# Altium footprint library ArduinoMega.PcbLib: 1 footprints
Each footprint in its own frame and in the unit in brackets; x right, y up, seen from the top. Pads: shape width x height; smd on the part's side, far side on the other; paste and mask are expansions set on the pad; w line width, h text height; cw(c..) or ccw(c..) is an arc to the next point about the centre after c.
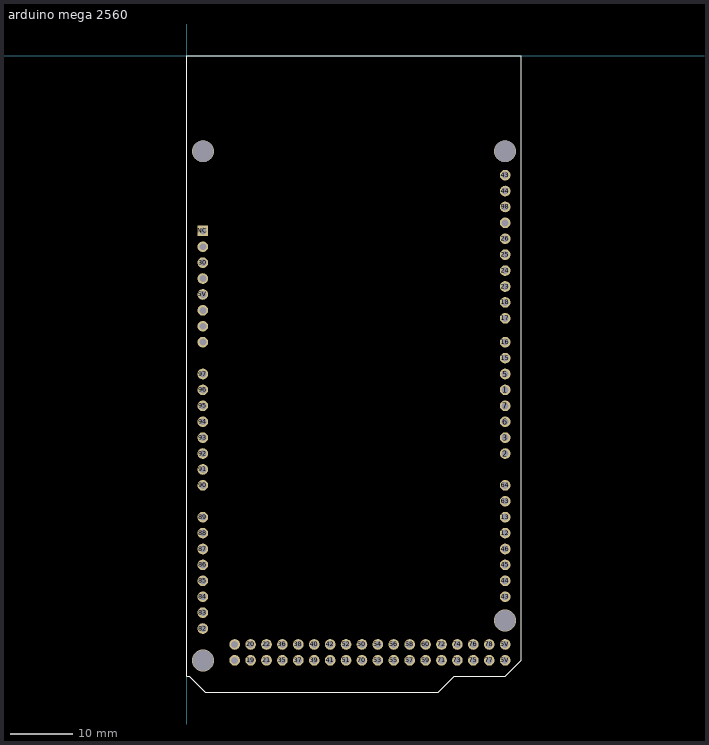
[diagram p0: the footprint, top view; thin cyan lines are the x and y axes]

## arduino mega 2560 [mm]
pads (86):
  round 1.7 hole 1.1: 1(50.8,-53.34) 2(50.8,-63.5) 3(50.8,-60.96) 3v3(2.54,-35.56) 5(50.8,-50.8) 5V(2.54,-38.1) 5V(50.8,-96.52) 5V(50.8,-93.98) 6(50.8,-58.42) 7(50.8,-55.88) 12(50.8,-76.2) 13(50.8,-73.66) 15(50.8,-48.26) 16(50.8,-45.72) 17(50.8,-41.91) 18(50.8,-39.37) 19(10.16,-96.52) 20(10.16,-93.98) 21(12.7,-96.52) 22(12.7,-93.98) 23(50.8,-36.83) 24(50.8,-34.29) 25(50.8,-31.75) 26(50.8,-29.21) 30(2.54,-33.02) 35(15.24,-96.52) 36(15.24,-93.98) 37(17.78,-96.52) 38(17.78,-93.98) 39(20.32,-96.52) 40(20.32,-93.98) 41(22.86,-96.52) 42(22.86,-93.98) 43(50.8,-86.36) 43(50.8,-19.05) 44(50.8,-83.82) 44(50.8,-21.59) 45(50.8,-81.28) 46(50.8,-78.74) 50(27.94,-93.98) 51(25.4,-96.52) 52(25.4,-93.98) 53(30.48,-96.52) 54(30.48,-93.98) 55(33.02,-96.52) 56(33.02,-93.98) 57(35.56,-96.52) 58(35.56,-93.98) 59(38.1,-96.52) 60(38.1,-93.98) 63(50.8,-71.12) 64(50.8,-68.58) 70(27.94,-96.52) 71(40.64,-96.52) 72(40.64,-93.98) 73(43.18,-96.52) 74(43.18,-93.98) 75(45.72,-96.52) 76(45.72,-93.98) 77(48.26,-96.52) 78(48.26,-93.98) 82(2.54,-91.44) 83(2.54,-88.9) 84(2.54,-86.36) 85(2.54,-83.82) 86(2.54,-81.28) 87(2.54,-78.74) 88(2.54,-76.2) 89(2.54,-73.66) 90(2.54,-68.58) 91(2.54,-66.04) 92(2.54,-63.5) 93(2.54,-60.96) 94(2.54,-58.42) 95(2.54,-55.88) 96(2.54,-53.34) 97(2.54,-50.8) 98(50.8,-24.13) GND(2.54,-43.18) GND(2.54,-40.64) GND(7.62,-96.52) GND(7.62,-93.98) GND(50.8,-26.67) VCC(2.54,-30.48) Vin(2.54,-45.72)
  rect 1.7x1.7 hole 1.1: NC(2.54,-27.94)
via 50.8,-15.24 diameter 3.5 hole 3.38
via 2.54,-15.24 diameter 3.5 hole 3.38
via 2.54,-96.52 diameter 3.5 hole 3.38
via 50.8,-90.17 diameter 3.5 hole 3.38
Top Overlay:
  lines w0.1: 43.18,-99.06 42.64,-99.06 ; 42.64,-99.06 50.8,-99.06 53.34,-96.52 53.34,0 0,0 0,-99.06 0.4,-99.06 2.94,-101.6 40.1,-101.6 42.64,-99.06 ; 0,-2.54 0,-2.54
3D body "arduino_MEGA2650.STEP": height 13.05, standoff -2.2, extent 0,-101.6 53.34,6.35